# Altium footprint library tianxiaohua_PcbLib.PcbLib: 138 footprints (part 9 of 9)
Each footprint in its own frame and in the unit in brackets; x right, y up, seen from the top. Pads: shape width x height; smd on the part's side, far side on the other; paste and mask are expansions set on the pad; w line width, h text height; cw(c..) or ccw(c..) is an arc to the next point about the centre after c.
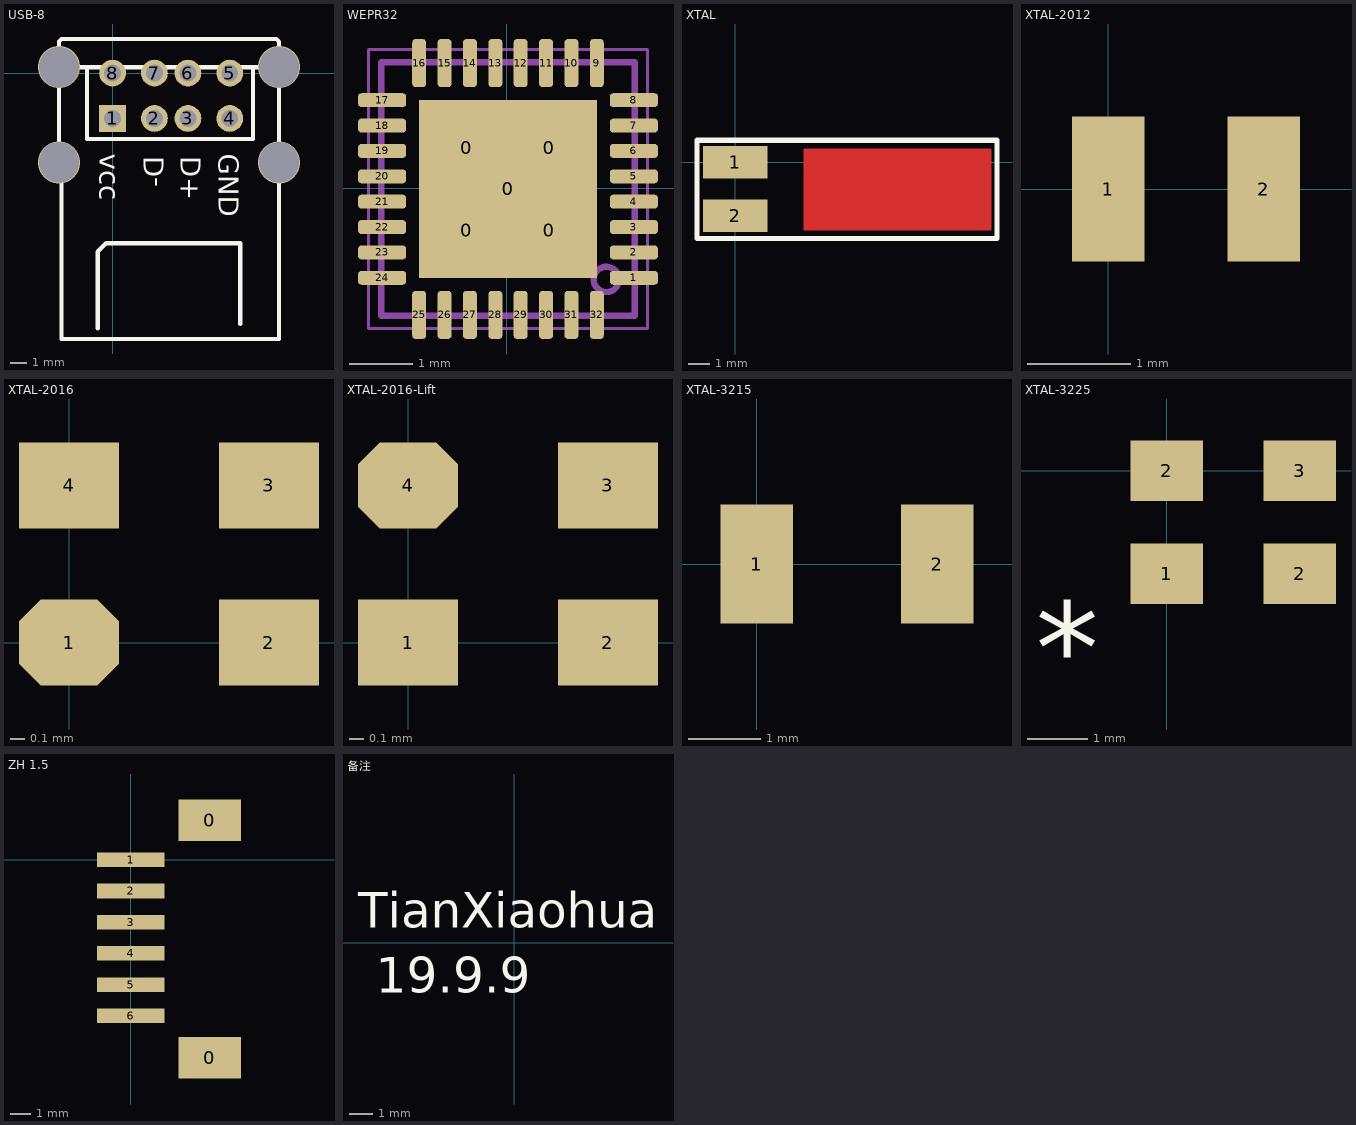
[diagram p8: the footprints below, top view; thin cyan lines are the x and y axes]

## USB-8 [mm]
pads (8):
  rect 1.6x1.6 hole 1: 1(0,-2.71)
  round 1.6 hole 1: 2(2.5,-2.71) 3(4.5,-2.71) 4(7,-2.71) 5(7,0) 6(4.5,0) 7(2.5,0) 8(0,0)
via -3.2,0.35 diameter 2.5 hole 2.4
via 9.94,0.35 diameter 2.5 hole 2.4
via -3.2,-5.33 diameter 2.5 hole 2.4
via 9.94,-5.33 diameter 2.5 hole 2.4
Top Overlay:
  lines w0.254: -1.524,0.35 -1.524,-3.937 8.382,-3.937 8.382,0.35 ; -0.889,-15.24 -0.889,-10.668 -0.381,-10.16 7.62,-10.16 7.62,-14.986 ; -3.2,0.35 9.94,0.35 ; -3.2,0.35 -3.2,-5.33 -3.048,-5.482 -3.048,-15.875 9.94,-15.875 9.94,0.35 ; -3.2,0.35 -3.2,1.88 -3.048,2.032 9.779,2.032 9.94,1.871 9.94,0.35
  text "vcc" at -0.762,-4.826 h1.2
  text "GND" at 6.35,-4.826 h1.2
  text "D+" at 4.064,-4.953 h1.2
  text "D-" at 3.048,-4.953 h1.2
3D body: height 16, standoff 0, extent -3.302,-16.002 9.906,2.032

## WEPR32 [mm]
pads (37):
  rrect50% 1.1x1.1 on Top Paste: 0(-0.634,-0.658) 0(-0.634,0.642) 0(0.667,-0.658) 0(0.667,0.642)
  rect 2.8x2.8 smd paste-10: 0(0.016,-0.008)
  rrect50% 0.76x0.22 smd: 1(2.001,-1.408) 2(2.001,-1.008) 3(2.001,-0.608) 4(2.001,-0.208) 5(2.001,0.192) 6(2.001,0.592) 7(2.001,0.992) 8(2.001,1.392) 17(-1.968,1.392) 18(-1.968,0.992) 19(-1.968,0.592) 20(-1.968,0.192) 21(-1.968,-0.208) 22(-1.968,-0.608) 23(-1.968,-1.008) 24(-1.968,-1.408)
  rrect50% 0.22x0.76 smd: 9(1.416,1.977) 10(1.017,1.977) 11(0.616,1.977) 12(0.216,1.977) 13(-0.183,1.977) 14(-0.583,1.977) 15(-0.984,1.977) 16(-1.383,1.977) 25(-1.383,-1.993) 26(-0.984,-1.993) 27(-0.583,-1.993) 28(-0.183,-1.993) 29(0.216,-1.993) 30(0.616,-1.993) 31(1.017,-1.993) 32(1.416,-1.993)
Mechanical 11:
  circle w0.1: c1.566,-1.433 r0.2
  lines w0.1: -1.984,-2.008 -1.984,1.992 2.017,1.992 2.017,-2.008 -1.984,-2.008
  text ".Designator" at -0.334,-0.258 h0.6
Mechanical 15:
  lines w0.05: -0.483,-0.008 0.516,-0.008 ; 0.016,-0.508 0.016,0.492 ; -2.184,-2.208 -2.184,2.192 2.217,2.192 2.217,-2.208 -2.184,-2.208
3D body: height 0.56, standoff 0, extent 1.367,-1.632 1.766,-1.234
3D body: height 0.55, standoff 0.05, extent -1.983,-2.008 2.017,1.992

## XTAL [mm] "卧式安装"
height 3
pads (2):
  rect 3x1.5 smd: 1(0,0) 2(0,-2.5)
Top Layer:
  rectangle: 3.175,-3.175 11.938,0.635
Top Overlay:
  lines w0.254: -1.778,-3.556 -1.778,1.016 12.192,1.016 12.192,-3.556 -1.778,-3.556
3D body "xtal.STEP": height 3, standoff 0, extent -1.216,-2.75 10.516,0.25

## XTAL-2012 [mm]
pads (2):
  rect 0.7x1.4 smd: 1(0,0) 2(1.5,0)
3D body: height 0.55, standoff 0.01, extent -0.097,-0.516 1.645,0.516
3D body: height 0.4, standoff 0, extent -0.21,-0.688 1.758,0.688

## XTAL-2016 [mm] "缺的角在右边"
pads (4):
  oct 0.7x0.6 smd: 1(0,0)
  rect 0.7x0.6 smd: 2(1.4,0) 3(1.4,1.1) 4(0,1.1)
3D body: height 0.4, standoff 0, extent -0.275,-0.235 1.694,1.396
3D body: height 0.55, standoff 0.01, extent -0.161,-0.064 1.58,1.226

## XTAL-2016-Lift [mm] "缺的角在左边"
pads (4):
  rect 0.7x0.6 smd: 1(0,0) 2(1.4,0) 3(1.4,1.1)
  oct 0.7x0.6 smd: 4(0,1.1)
3D body: height 0.55, standoff 0.01, extent -0.161,-0.064 1.58,1.226
3D body: height 0.4, standoff 0, extent -0.275,-0.235 1.694,1.396

## XTAL-3215 [mm]
pads (2):
  rect 1x1.65 smd: 1(0,0) 2(2.5,0)
3D body: height 0.25, standoff 0, extent 0,0 0,0
3D body "User Library-Crystal FC-135.STEP": height 0.8, standoff 0, extent -0.33,-0.75 2.87,0.75

## XTAL-3225 [mm]
pads (4):
  rect 1.2x1 smd: 1(0,-1.7) 2(0,0) 2(2.2,-1.7) 3(2.2,0)
Top Overlay:
  text "*" at -2.159,-3.683 h1.52
3D body "User Library-3225-1.step": height 0.61, standoff 0, extent -0.426,-2.153 2.773,0.347

## ZH 1.5 [mm]
pads (8):
  rect 3x2 smd: 0(3.81,-9.525) 0(3.81,1.905)
  rect 3.25x0.7 smd: 1(0,0) 2(0,-1.5) 3(0,-3) 4(0,-4.5) 5(0,-6) 6(0,-7.5)
3D body "User Library-ZH1_5-6P.STEP": height 5, standoff 0, extent -0.374,-9.81 4.826,2.19

## 备注 [mm]
Top Overlay:
  text "TianXiaohua" at -6.731,0.635 h1.52
  text "19.9.9" at -5.969,-2.159 h1.52